# Altium footprint library XU-GENARAL PCB .PcbLib: 1176 footprints (part 9 of 75)
Each footprint in its own frame and in the unit in brackets; x right, y up, seen from the top. Pads: shape width x height; smd on the part's side, far side on the other; paste and mask are expansions set on the pad; w line width, h text height; cw(c..) or ccw(c..) is an arc to the next point about the centre after c.
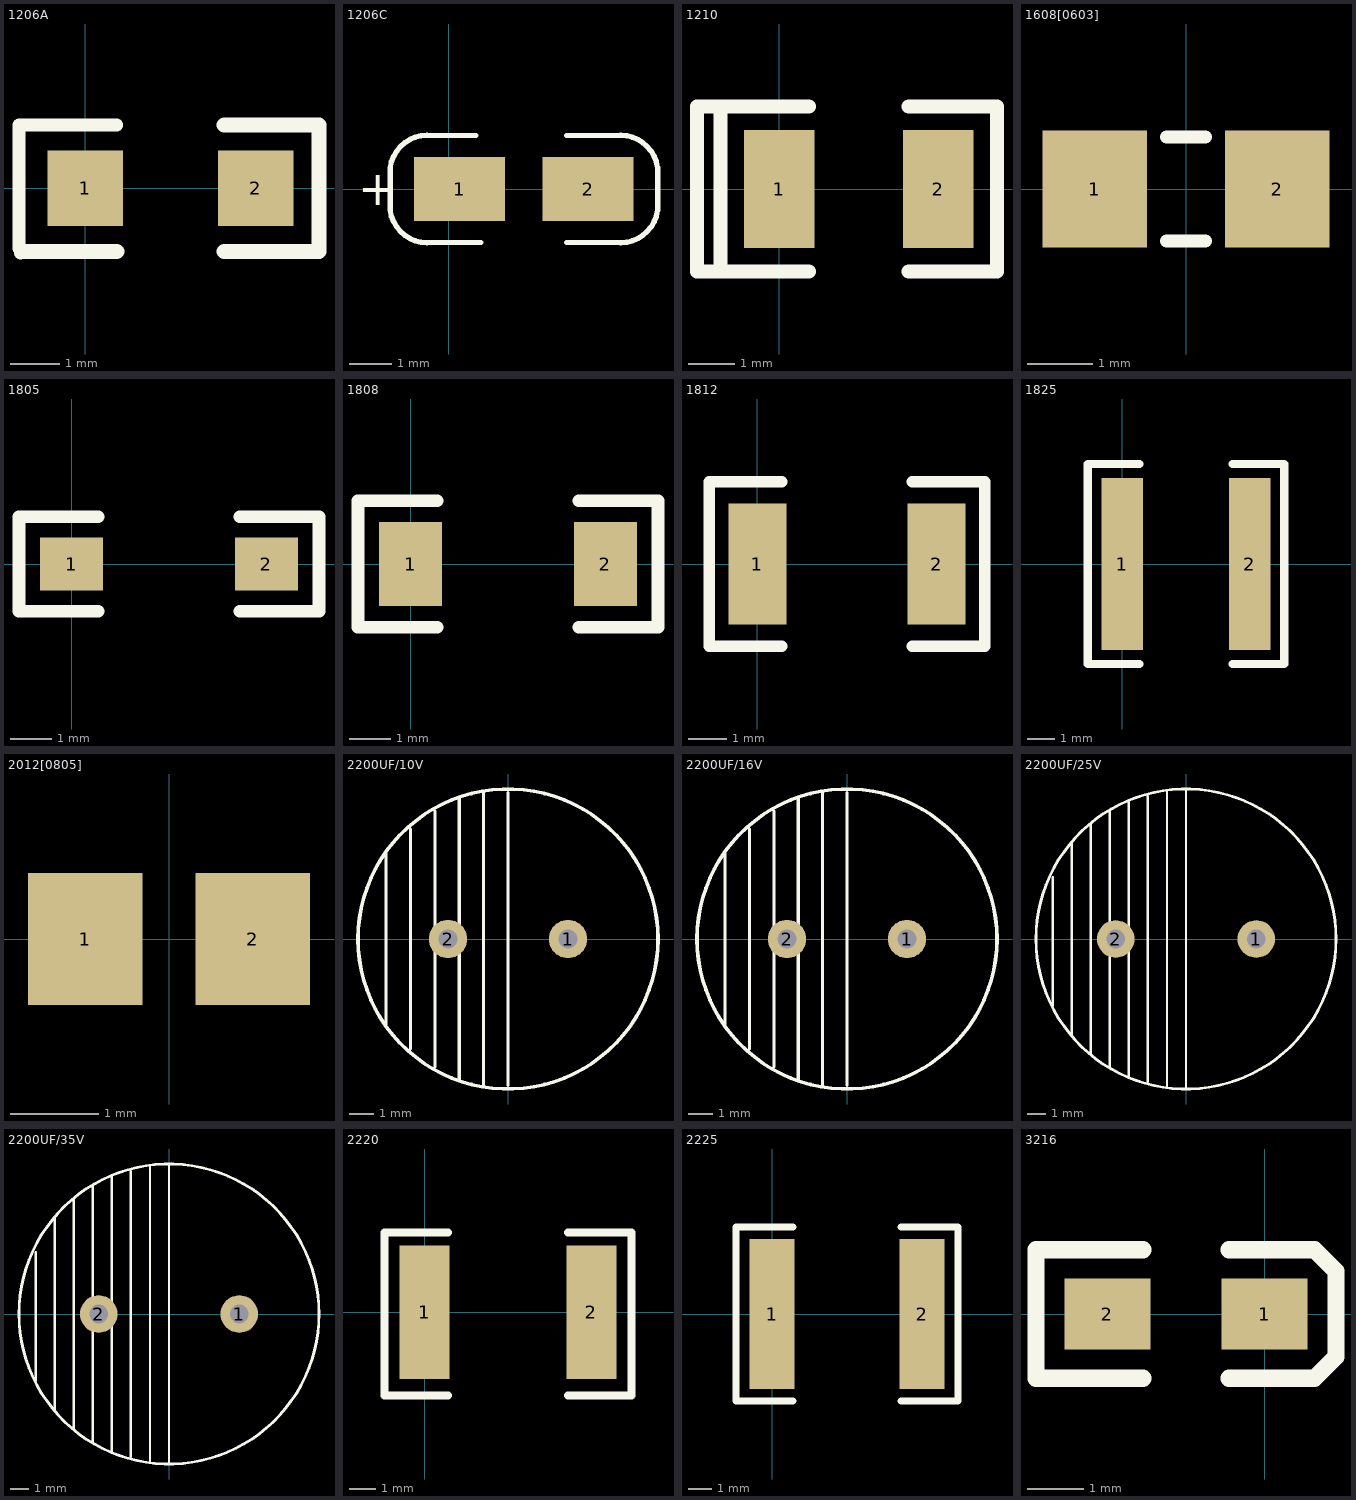
[diagram p8: the footprints below, top view; thin cyan lines are the x and y axes]

## 1206A [mil]
pads (2):
  rect 60x60 smd: 1(0,0) 2(135,0)
Top Overlay:
  lines w10: -52.36,-47.64 -52.36,50 -50,50 25,50 ; -51.18,-51.18 -50,-50
  lines w12: -50,-50 25,-50 ; 110,-50 185,-50 185,50 110,50

## 1206C [mil]
pads (2):
  rect 85x60 smd: 1(10,0) 2(130,0)
Top Overlay:
  lines w5: -20,50 25,50 ; -15,50 ccw(c-20,15) -55,20 -55,-20 ccw(c-20,-15) -15,-50 30,-50 ; 110,-50 155,-50 ccw(c160,-15) 195,-20 195,20 ccw(c160,15) 155,50 110,50
  text "+" at -85,-15 h32

## 1210 [mil]
pads (2):
  rect 60x100 smd: 1(0,0) 2(135,0)
Top Overlay:
  lines w12: -40,70 -70,70 -70,-70 -50,-70 ; 25,-70 -50,-70 ; 25,70 -50,70 -50,-70 ; 110,-70 185,-70 185,70 110,70

## 1608[0603] [mm]
pads (2):
  rect 1.6x1.8 smd: 1(-1.4,0) 2(1.4,0)
Top Overlay:
  lines w0.2: -0.3,-0.8 0.3,-0.8 ; -0.3,0.8 0.3,0.8

## 1805 [mil]
pads (2):
  rect 60x50 smd: 1(0,0) 2(185,0)
Top Overlay:
  lines w12: 25,-45 -50,-45 -50,45 25,45 ; 160,-45 235,-45 235,45 160,45

## 1808 [mil]
pads (2):
  rect 60x80 smd: 1(0,0) 2(185,0)
Top Overlay:
  lines w12: 25,-60 -50,-60 -50,60 25,60 ; 160,-60 235,-60 235,60 160,60

## 1812 [mil]
pads (2):
  rect 60x125 smd: 1(0,0) 2(185,0)
Top Overlay:
  lines w12: 25,-85 -50,-85 -50,85 25,85 ; 160,-85 235,-85 235,85 160,85

## 1825 [mil]
pads (2):
  rect 60x250 smd: 1(0,0) 2(185,0)
Top Overlay:
  lines w12: 25,-145 -50,-145 -50,145 25,145 ; 160,-145 235,-145 235,145 160,145

## 2012[0805] [mm]
height 1.75
pads (2):
  rect 1.3x1.5 smd: 1(-0.95,0) 2(0.95,0)

## 2200UF/10V [mm]
pads (2):
  round 1.6 hole 0.8: 1(2.5,0) 2(-2.5,0)
Top Overlay:
  circle w0.152: c0,0 r6.25
  rectangle: -2.032,-2.032 -2.032,2.032
  lines w0.127: -5.08,-3.556 -5.08,3.556 ; -4.064,-4.572 -4.064,4.572 ; -4.064,-2.794 -4.064,2.794 ; -3.048,-5.334 -3.048,5.334 ; -3.048,-3.81 -3.048,3.81 ; -2.032,-5.842 -2.032,5.842 ; -2.032,-4.572 -2.032,4.572 ; -1.016,-6.096 -1.016,6.096 ; -1.016,-4.826 -1.016,4.826 ; 0,-6.096 0,6.096 ; 0,-5.08 0,4.826

## 2200UF/16V [mm]
pads (2):
  round 1.6 hole 0.8: 1(2.5,0) 2(-2.5,0)
Top Overlay:
  circle w0.152: c0,0 r6.25
  rectangle: -2.032,-2.032 -2.032,2.032
  lines w0.127: -5.08,-3.556 -5.08,3.556 ; -4.064,-4.572 -4.064,4.572 ; -4.064,-2.794 -4.064,2.794 ; -3.048,-5.334 -3.048,5.334 ; -3.048,-3.81 -3.048,3.81 ; -2.032,-5.842 -2.032,5.842 ; -2.032,-4.572 -2.032,4.572 ; -1.016,-6.096 -1.016,6.096 ; -1.016,-4.826 -1.016,4.826 ; 0,-6.096 0,6.096 ; 0,-5.08 0,4.826

## 2200UF/25V [mm]
pads (2):
  round 2 hole 1: 1(3.75,0) 2(-3.75,0)
Top Overlay:
  circle w0.152: c0,0 r8
  rectangle: -2.032,-2.032 -2.032,2.032
  lines w0.127: -7.112,-3.556 -7.112,3.302 ; -6.096,-5.08 -6.096,5.08 ; -5.08,-6.096 -5.08,6.096 ; -4.064,-6.858 -4.064,6.858 ; -3.048,-7.366 -3.048,7.366 ; -2.032,-7.62 -2.032,7.62 ; -1.016,-7.874 -1.016,7.874 ; 0,-7.874 0,7.874 ; 0,-5.08 0,4.826

## 2200UF/35V [mm]
pads (2):
  round 2 hole 1: 1(3.75,0) 2(-3.75,0)
Top Overlay:
  circle w0.152: c0,0 r8
  rectangle: -2.032,-2.032 -2.032,2.032
  lines w0.127: -7.112,-3.556 -7.112,3.302 ; -6.096,-5.08 -6.096,5.08 ; -5.08,-6.096 -5.08,6.096 ; -4.064,-6.858 -4.064,6.858 ; -3.048,-7.366 -3.048,7.366 ; -2.032,-7.62 -2.032,7.62 ; -1.016,-7.874 -1.016,7.874 ; 0,-7.874 0,7.874 ; 0,-5.08 0,4.826

## 2220 [mil]
pads (2):
  rect 75x200 smd: 1(0,0) 2(250,0)
Top Overlay:
  lines w12: 35,-125 -60,-125 -60,120 35,120 ; 215,-125 310,-125 310,120 215,120

## 2225 [mil]
pads (2):
  rect 75x250 smd: 1(0,0) 2(250,0)
Top Overlay:
  lines w12: 35,-145 -60,-145 -60,145 35,145 ; 215,-145 310,-145 310,145 215,145

## 3216 [mil]
pads (2):
  rect 60x50 smd: 1(0,0) 2(-110,0)
Top Overlay:
  lines w12: -85,-45 -160,-45 -160,45 -85,45 ; -25,-45 35,-45 50,-30 50,30 35,45 -25,45